# Altium footprint library TYCO THD.PcbLib: 146 footprints (part 8 of 11) (continued)
## TYCO_1734354-1 [mm] "Right Angle D-SUB 9 Female Contacts, Shell Size 9, With Threaded Insert (4-40 UNC). AMPLIMITE HD-20 Series" (continued)
  text "9" at 5.75,0.925 h1.2
3D body "TYCO_1734354-1.stp": height 12.52, standoff -4.07, extent -15.4,-2.902 15.4,15.518

## TYCO_1734366-1 [mm] "4 Position, Straight, USB 2.0 Type A Receptacle"
height 15
pads (6):
  round 1.6 hole 0.9: 1(-3.5,0) 2(-1,0) 3(1,0) 4(3.5,0)
  round 3 hole 2.3: 5(-6.57,-2.71) 5(6.57,-2.71)
Top Overlay:
  lines w0.2: -7.25,-0.99 -7.25,0.36 cw(c-6.95,0.36) -6.95,0.66 -6.25,0.66 ; -6.55,0.66 -6.55,0.96 ; -6.55,0.962 cw(c-5.912,0.962) -5.912,1.6 -5.61,1.6 ; -6.25,-0.888 -6.25,0.96 -6.25,0.962 cw(c-5.912,0.962) -5.912,1.3 -5.91,1.3 5.91,1.3 5.912,1.3 cw(c5.912,0.962) 6.25,0.962 6.25,0.96 6.25,-0.888 ; -6.25,-0.238 -5.68,-0.77 -5.68,-1.088 ; -5.61,-4.291 -5.61,-4.52 ccw(c-5.31,-4.52) -5.31,-4.82 5.31,-4.82 ccw(c5.31,-4.52) 5.61,-4.52 5.61,-4.291 ; -5.61,1.3 -5.61,2 cw(c-5.31,2) -5.31,2.3 5.31,2.3 cw(c5.31,2) 5.61,2 5.61,1.3 ; -5.55,-1.167 -5.55,-0.02 cw(c-4.91,-0.02) -4.91,0.62 -4.469,0.62 ; -5.473,-1.22 5.473,-1.22 ; -5.43,-1.22 -5.05,-0.84 ; -5.363,0.433 -5.05,0.12 ; -5.09,-3.82 5.09,-3.82 ; -4.644,0.12 -5.05,0.12 ; -4.285,-0.84 -5.05,-0.84 ; -3.8,-1.22 -3.8,-1.813 -3.2,-1.813 -3.2,-1.22 ; -3.72,-3.82 -3.603,-3.245 -2.384,-3.245 -2.27,-3.82 ; -1.3,-1.22 -1.3,-1.813 -0.7,-1.813 -0.7,-1.22 ; 0.7,-1.22 0.7,-1.813 1.3,-1.813 1.3,-1.22 ; 2.269,-3.82 2.386,-3.245 3.605,-3.245 3.719,-3.82 ; 3.2,-1.22 3.2,-1.813 3.8,-1.813 3.8,-1.22 ; 4.285,-0.84 5.05,-0.84 ; 4.469,0.62 4.91,0.62 cw(c4.91,-0.02) 5.55,-0.02 5.55,-1.167 ; 4.644,0.12 5.05,0.12 ; 5.363,0.433 5.05,0.12 ; 5.43,-1.22 5.05,-0.84 ; 5.61,1.6 5.91,1.6 5.912,1.6 cw(c5.912,0.962) 6.55,0.962 6.55,0.96 6.55,0.66 ; 5.68,-1.088 5.68,-0.765 6.25,-0.238 ; 6.25,-3.482 6.25,-3.48 ; 6.25,0.66 6.95,0.66 cw(c6.95,0.36) 7.25,0.36 7.25,-0.99 ; -5.05,-0.84 -5.05,0.12 ; 5.05,-0.84 5.05,0.12
Mechanical 8:
  lines w0.05: -7.07,-2.71 -6.57,-2.71 ; -6.57,-3.21 -6.57,-2.71 ; -6.57,-2.21 -6.57,-2.71 ; -6.07,-2.71 -6.57,-2.71 ; -4,0 -3.5,0 ; -3.5,-0.5 -3.5,0 ; -3.5,0.5 -3.5,0 ; -3,0 -3.5,0 ; -1.5,0 -1,0 ; -1,-0.5 -1,0 ; -1,0.5 -1,0 ; 0,-0.5 0,0 ; 0,0.5 0,0 ; 1,-0.5 1,0 ; 1,0.5 1,0 ; 1.5,0 1,0 ; 3,0 3.5,0 ; 3.5,-0.5 3.5,0 ; 3.5,0.5 3.5,0 ; 4,0 3.5,0 ; 6.07,-2.71 6.57,-2.71 ; 6.57,-3.21 6.57,-2.71 ; 6.57,-2.21 6.57,-2.71 ; 7.07,-2.71 6.57,-2.71 ; -3.5,0 -1,0 ; -1,0 -0.5,0 0,0 ; 0,0 0.5,0 1,0 ; 1,0 3.5,0
Mechanical 14:
  lines w0.1: -7.25,-1.824 -7.9,-1.91 -7.9,-3.43 -6.537,-3.611 ; -6.55,-3.18 -6.55,-3.48 -6.55,-3.482 ccw(c-5.912,-3.482) -5.912,-4.12 ; -6.55,0.66 -6.55,0.96 ; -6.55,0.962 cw(c-5.912,0.962) -5.912,1.6 -5.61,1.6 ; -6.25,-3.18 -6.95,-3.18 cw(c-6.95,-2.88) -7.25,-2.88 -7.25,0.36 cw(c-6.95,0.36) -6.95,0.66 -6.25,0.66 ; -6.25,-2.282 -5.68,-1.75 -5.68,-0.77 -6.25,-0.238 ; -5.91,-4.12 -5.912,-4.12 ; -5.61,-4.12 -5.912,-4.12 ; -5.61,-3.82 -5.61,-4.52 ccw(c-5.31,-4.52) -5.31,-4.82 5.31,-4.82 ccw(c5.31,-4.52) 5.61,-4.52 5.61,-3.82 ; -5.61,1.3 -5.61,2 cw(c-5.31,2) -5.31,2.3 5.31,2.3 cw(c5.31,2) 5.61,2 5.61,1.3 ; -5.43,-1.22 -5.05,-0.84 ; -5.363,0.433 -5.05,0.12 ; -3.8,-1.22 -3.8,-1.813 -3.2,-1.813 -3.2,-1.22 ; -3.72,-3.82 -3.603,-3.245 -2.384,-3.245 -2.27,-3.82 ; -3.72,1.3 -3.603,0.725 -2.384,0.725 -2.27,1.3 ; -1.3,-1.22 -1.3,-1.813 -0.7,-1.813 -0.7,-1.22 ; 0.7,-1.22 0.7,-1.813 1.3,-1.813 1.3,-1.22 ; 2.269,-3.82 2.386,-3.245 3.605,-3.245 3.719,-3.82 ; 2.269,1.3 2.386,0.725 3.605,0.725 3.719,1.3 ; 3.2,-1.22 3.2,-1.813 3.8,-1.813 3.8,-1.22 ; 5.363,0.433 5.05,0.12 ; 5.43,-1.22 5.05,-0.84 ; 5.61,-4.12 5.91,-4.12 5.912,-4.12 ccw(c5.912,-3.482) 6.55,-3.482 6.55,-3.48 6.55,-3.18 ; 5.61,1.6 5.91,1.6 5.912,1.6 cw(c5.912,0.962) 6.55,0.962 6.55,0.96 6.55,0.66 ; 6.25,-3.18 6.95,-3.18 ccw(c6.95,-2.88) 7.25,-2.88 7.25,0.36 ccw(c6.95,0.36) 6.95,0.66 6.25,0.66 ; 6.25,-2.282 5.68,-1.755 5.68,-0.765 6.25,-0.238 ; 6.537,-3.611 7.9,-3.43 7.9,-1.91 7.25,-1.824 ; -5.05,-0.84 -5.05,0.12 ; -5.05,-0.84 5.05,-0.84 ; -5.05,0.12 5.05,0.12 ; 5.05,-0.84 5.05,0.12 ; -6.25,-3.482 ccw(c-5.912,-3.482) -5.912,-3.82 -5.91,-3.82 5.91,-3.82 5.912,-3.82 ccw(c5.912,-3.482) 6.25,-3.482 6.25,-3.48 6.25,0.96 6.25,0.962 ccw(c5.912,0.962) 5.912,1.3 5.91,1.3 -5.91,1.3 -5.912,1.3 ccw(c-5.912,0.962) -6.25,0.962 -6.25,0.96 -6.25,-3.48 -6.25,-3.482 ; -5.55,-1.22 -5.55,-0.02 cw(c-4.91,-0.02) -4.91,0.62 4.91,0.62 cw(c4.91,-0.02) 5.55,-0.02 5.55,-1.22 -5.55,-1.22
3D body "TYCO_1734366-1.stp": height 15, standoff -3.93, extent -7.899,-4.82 7.9,2.3

## TYCO_1761014-1 [mm] "SFP+ 1x1 Press Fit Cage"
height 9.7
pads (30):
  rect 2x2 hole 1.05: 1(-14.25,-30.9) 2(-14.25,-20.9) 3(-14.25,-10.9) 4(-14.25,-0.9) 5(14.25,4.1) 6(14.25,-5.9) 7(14.25,-15.9) 8(14.25,-25.9) 9(-5.675,-30.9) 10(-8.575,-10.9) 11(-3.175,-10.9) 12(8.575,-30.9) 13(5.675,-10.9) 14(11.075,-10.9)
  round 2 hole 1.05: 15(0,-30.9) 16(0,-23.8) 17(0,-9.6) 18(0,-2.5)
  round 1.65 hole 0.95: 19(-14.25,-8.1) 20(-14.25,-3.4) 21(-14.25,1.6) 22(-11.925,7.475) 23(-7.125,7.475) 24(-2.325,7.475) 25(2.325,7.475) 26(7.125,7.475) 27(11.925,7.475) 28(14.25,1.6) 29(14.25,-3.4) 30(14.25,-8.1)
Top Overlay:
  drawing of 234 lines, arcs and shapes, not listed
Mechanical 8:
  drawing of 407 lines, arcs and shapes, not listed
  text "11" at -4.225,1.6 h1
  text "20" at -11.613,1.6 h1
  text "10" at -3.925,-2.6 h1
  text "1" at -10.775,-2.6 h1
  text "11" at 10.025,1.6 h1
  text "20" at 2.637,1.6 h1
  text "10" at 10.325,-2.6 h1
  text "1" at 3.475,-2.6 h1
Mechanical 14:
  drawing of 224 lines, arcs and shapes, not listed
Drill Drawing:
  lines w0.1: -12.5,-8.5 -11,-10 -11,-18 10.139,-18 ; -12,-21 10,-21 ; -15.75,-32.4 -15.75,8.975 15.75,8.975 15.75,-32.4 -15.75,-32.4
  text "12x diam. 0.95mm +/-0.05" at -10,-17.5 h1
  text "18x diam. 1.05mm +/-0.05" at -10,-20.5 h1
  text "PRESS-FIT TECHNOLOGY" at -8,-15 h1
3D body "TYCO_1761014-1.stp": height 10.37, standoff -2.06, extent -15.043,-42.4 15.043,7.854

## TYCO_1814655-3 [mm] "4 Positions, Pitch 2.54mm, Width 2.54mm, Heigh 4.4mm, SIP Straight Socket"
height 4.4
pads (4):
  round 1.5 hole 0.8: 1(0,0) 2(2.54,0) 3(5.08,0) 4(7.62,0)
Top Overlay:
  lines w0.2: 1.27,-0.77 1.27,0.77 ; 1.27,-0.77 1.77,-1.27 3.31,-1.27 3.81,-0.77 ; 1.27,-0.77 0.77,-1.27 -0.77,-1.27 -1.27,-0.77 -1.27,0.77 -0.77,1.27 0.77,1.27 1.27,0.77 ; 1.27,0.77 1.77,1.27 3.31,1.27 3.81,0.77 ; 3.81,-0.77 3.81,0.77 ; 3.81,-0.77 4.31,-1.27 5.85,-1.27 6.35,-0.77 ; 3.81,0.77 4.31,1.27 5.85,1.27 6.35,0.77 ; 6.35,-0.77 6.35,0.77 ; 6.35,-0.77 6.85,-1.27 8.39,-1.27 8.89,-0.77 8.89,0.77 8.39,1.27 6.85,1.27 6.35,0.77
Mechanical 8:
  lines w0.1: -1,0 0,0 ; 0,-1 0,0 ; 0,1 0,0 ; 1,0 0,0 ; 1.54,0 2.54,0 ; 2.54,-1 2.54,0 ; 2.54,1 2.54,0 ; 3.54,0 2.54,0 ; 4.08,0 5.08,0 ; 5.08,-1 5.08,0 ; 5.08,1 5.08,0 ; 6.08,0 5.08,0 ; 6.62,0 7.62,0 ; 7.62,-1 7.62,0 ; 7.62,1 7.62,0 ; 8.62,0 7.62,0
Mechanical 14:
  lines w0.1: 1.27,-0.77 1.27,0.77 ; 1.27,-0.77 1.77,-1.27 3.31,-1.27 3.81,-0.77 ; 1.27,-0.77 0.77,-1.27 -0.77,-1.27 -1.27,-0.77 -1.27,0.77 -0.77,1.27 0.77,1.27 1.27,0.77 ; 1.27,0.77 1.77,1.27 3.31,1.27 3.81,0.77 ; 3.81,-0.77 3.81,0.77 ; 3.81,-0.77 4.31,-1.27 5.85,-1.27 6.35,-0.77 ; 3.81,0.77 4.31,1.27 5.85,1.27 6.35,0.77 ; 6.35,-0.77 6.35,0.77 ; 6.35,-0.77 6.85,-1.27 8.39,-1.27 8.89,-0.77 8.89,0.77 8.39,1.27 6.85,1.27 6.35,0.77
3D body "TYCO_1814655-3.stp": height 4.4, standoff -2.9, extent -1.27,-1.27 8.89,1.27

## TYCO_1814655-3_a [mm] "1 of 4 Positions, Pitch 2.54mm, Width 2.54mm, Heigh 4.4mm, SIP Straight Socket"
height 4.4
pads (1):
  round 1.5 hole 0.8: 1(0,0)
Top Overlay:
  lines w0.2: -1.27,-0.77 -0.77,-1.27 0.77,-1.27 1.27,-0.77 1.27,0.77 0.77,1.27 -0.77,1.27 -1.27,0.77 -1.27,-0.77
Mechanical 8:
  lines w0.1: -1,0 0,0 ; 0,-1 0,0 ; 0,1 0,0 ; 1,0 0,0
Mechanical 14:
  lines w0.1: -1.27,-0.77 -0.77,-1.27 0.77,-1.27 1.27,-0.77 1.27,0.77 0.77,1.27 -0.77,1.27 -1.27,0.77 -1.27,-0.77
3D body "TYCO_1814655-3_a.stp": height 4.4, standoff -2.9, extent -1.27,-1.27 1.27,1.27

## TYCO_1814655-7 [mm] "10 Positions, Pitch 2.54mm, Width 2.54mm, Heigh 4.4mm, SIP Straight Socket"
height 4.4
pads (10):
  round 1.5 hole 0.8: 1(0,0) 2(2.54,0) 3(5.08,0) 4(7.62,0) 5(10.16,0) 6(12.7,0) 7(15.24,0) 8(17.78,0) 9(20.32,0) 10(22.86,0)
Top Overlay:
  lines w0.2: 1.27,-0.77 1.27,0.77 ; 1.27,-0.77 1.77,-1.27 3.31,-1.27 3.81,-0.77 ; 1.27,-0.77 0.77,-1.27 -0.77,-1.27 -1.27,-0.77 -1.27,0.77 -0.77,1.27 0.77,1.27 1.27,0.77 ; 1.27,0.77 1.77,1.27 3.31,1.27 3.81,0.77 ; 3.81,-0.77 3.81,0.77 ; 3.81,-0.77 4.31,-1.27 5.85,-1.27 6.35,-0.77 ; 3.81,0.77 4.31,1.27 5.85,1.27 6.35,0.77 ; 6.35,-0.77 6.35,0.77 ; 6.35,-0.77 6.85,-1.27 8.39,-1.27 8.89,-0.77 ; 6.35,0.77 6.85,1.27 8.39,1.27 8.89,0.77 ; 8.89,-0.77 8.89,0.77 ; 8.89,-0.77 9.39,-1.27 10.93,-1.27 11.43,-0.77 ; 8.89,0.77 9.39,1.27 10.93,1.27 11.43,0.77 ; 11.43,-0.77 11.43,0.77 ; 11.43,-0.77 11.93,-1.27 13.47,-1.27 13.97,-0.77 ; 11.43,0.77 11.93,1.27 13.47,1.27 13.97,0.77 ; 13.97,-0.77 13.97,0.77 ; 13.97,-0.77 14.47,-1.27 16.01,-1.27 16.51,-0.77 ; 13.97,0.77 14.47,1.27 16.01,1.27 16.51,0.77 ; 16.51,-0.77 16.51,0.77 ; 16.51,-0.77 17.01,-1.27 18.55,-1.27 19.05,-0.77 ; 16.51,0.77 17.01,1.27 18.55,1.27 19.05,0.77 ; 19.05,-0.77 19.05,0.77 ; 19.05,-0.77 19.55,-1.27 21.09,-1.27 21.59,-0.77 ; 19.05,0.77 19.55,1.27 21.09,1.27 21.59,0.77 ; 21.59,-0.77 21.59,0.77 ; 21.59,-0.77 22.09,-1.27 23.63,-1.27 24.13,-0.77 24.13,0.77 23.63,1.27 22.09,1.27 21.59,0.77
Mechanical 8:
  lines w0.1: -1,0 0,0 ; 0,-1 0,0 ; 0,1 0,0 ; 1,0 0,0 ; 1.54,0 2.54,0 ; 2.54,-1 2.54,0 ; 2.54,1 2.54,0 ; 3.54,0 2.54,0 ; 4.08,0 5.08,0 ; 5.08,-1 5.08,0 ; 5.08,1 5.08,0 ; 6.08,0 5.08,0 ; 6.62,0 7.62,0 ; 7.62,-1 7.62,0 ; 7.62,1 7.62,0 ; 8.62,0 7.62,0 ; 9.16,0 10.16,0 ; 10.16,-1 10.16,0 ; 10.16,1 10.16,0 ; 11.16,0 10.16,0 ; 11.7,0 12.7,0 ; 12.7,-1 12.7,0 ; 12.7,1 12.7,0 ; 13.7,0 12.7,0 ; 14.24,0 15.24,0 ; 15.24,-1 15.24,0 ; 15.24,1 15.24,0 ; 16.24,0 15.24,0 ; 16.78,0 17.78,0 ; 17.78,-1 17.78,0 ; 17.78,1 17.78,0 ; 18.78,0 17.78,0 ; 19.32,0 20.32,0 ; 20.32,-1 20.32,0 ; 20.32,1 20.32,0 ; 21.32,0 20.32,0 ; 21.86,0 22.86,0 ; 22.86,-1 22.86,0 ; 22.86,1 22.86,0 ; 23.86,0 22.86,0
Mechanical 14:
  lines w0.1: 1.27,-0.77 1.27,0.77 ; 1.27,-0.77 1.77,-1.27 3.31,-1.27 3.81,-0.77 ; 1.27,-0.77 0.77,-1.27 -0.77,-1.27 -1.27,-0.77 -1.27,0.77 -0.77,1.27 0.77,1.27 1.27,0.77 ; 1.27,0.77 1.77,1.27 3.31,1.27 3.81,0.77 ; 3.81,-0.77 3.81,0.77 ; 3.81,-0.77 4.31,-1.27 5.85,-1.27 6.35,-0.77 ; 3.81,0.77 4.31,1.27 5.85,1.27 6.35,0.77 ; 6.35,-0.77 6.35,0.77 ; 6.35,-0.77 6.85,-1.27 8.39,-1.27 8.89,-0.77 ; 6.35,0.77 6.85,1.27 8.39,1.27 8.89,0.77 ; 8.89,-0.77 8.89,0.77 ; 8.89,-0.77 9.39,-1.27 10.93,-1.27 11.43,-0.77 ; 8.89,0.77 9.39,1.27 10.93,1.27 11.43,0.77 ; 11.43,-0.77 11.43,0.77 ; 11.43,-0.77 11.93,-1.27 13.47,-1.27 13.97,-0.77 ; 11.43,0.77 11.93,1.27 13.47,1.27 13.97,0.77 ; 13.97,-0.77 13.97,0.77 ; 13.97,-0.77 14.47,-1.27 16.01,-1.27 16.51,-0.77 ; 13.97,0.77 14.47,1.27 16.01,1.27 16.51,0.77 ; 16.51,-0.77 16.51,0.77 ; 16.51,-0.77 17.01,-1.27 18.55,-1.27 19.05,-0.77 ; 16.51,0.77 17.01,1.27 18.55,1.27 19.05,0.77 ; 19.05,-0.77 19.05,0.77 ; 19.05,-0.77 19.55,-1.27 21.09,-1.27 21.59,-0.77 ; 19.05,0.77 19.55,1.27 21.09,1.27 21.59,0.77 ; 21.59,-0.77 21.59,0.77 ; 21.59,-0.77 22.09,-1.27 23.63,-1.27 24.13,-0.77 24.13,0.77 23.63,1.27 22.09,1.27 21.59,0.77
3D body "TYCO_1814655-7.stp": height 4.4, standoff -2.9, extent -1.27,-1.27 24.13,1.27

## TYCO_1814655-7_a [mm] "1 of 10 Positions, Pitch 2.54mm, Width 2.54mm, Heigh 4.4mm, SIP Straight Socket"
height 4.4
pads (1):
  round 1.5 hole 0.8: 1(0,0)
Top Overlay:
  lines w0.2: -1.27,-0.77 -0.77,-1.27 0.77,-1.27 1.27,-0.77 1.27,0.77 0.77,1.27 -0.77,1.27 -1.27,0.77 -1.27,-0.77
Mechanical 8:
  lines w0.1: -1,0 0,0 ; 0,-1 0,0 ; 0,1 0,0 ; 1,0 0,0
Mechanical 14:
  lines w0.1: -1.27,-0.77 -0.77,-1.27 0.77,-1.27 1.27,-0.77 1.27,0.77 0.77,1.27 -0.77,1.27 -1.27,0.77 -1.27,-0.77
3D body "TYCO_1814655-7_a.stp": height 4.4, standoff -2.9, extent -1.27,-1.27 1.27,1.27

## TYCO_1840061-1 [mm] "1 Port, Without LED, RJ45 10/100Base-T Ethernet Vertical Connector Module With Integrated Magnetics"
height 16.51
pads (12):
  round 1.6 hole 0.9: 1(-4.445,-1.27) 2(-3.175,1.27) 3(-1.905,-1.27) 4(-0.635,1.27) 5(0.635,-1.27) 6(1.905,1.27) 7(3.175,-1.27) 8(4.445,1.27)
  round 2.3 hole 1.6: 9(-7.747,-4.572) 10(7.747,-4.572)
  round 0.5 hole 3.2 unplated mask+1.35: M1(-5.715,-7.62) M2(5.715,-7.62)
Top Overlay:
  lines w0.2: -8,-6.101 -8,-13.87 ccw(c-7.65,-13.87) -7.65,-14.22 7.65,-14.22 ccw(c7.65,-13.87) 8,-13.87 8,-6.101 ; -8,-3.043 -8,7.02 cw(c-7.65,7.02) -7.65,7.37 7.65,7.37 cw(c7.65,7.02) 8,7.02 8,-3.043 ; -6.382,-5.31 -6.2,-5.31 -6.2,-3.31 cw(c-6,-3.31) -6,-3.11 6,-3.11 cw(c6,-3.31) 6.2,-3.31 6.2,-5.31 6.382,-5.31 ; -6.2,-9.562 -6.2,-10.22 ccw(c-6,-10.22) -6,-10.42 -3.595,-10.42 cw(c-3.595,-10.62) -3.395,-10.62 -3.395,-12.02 ccw(c-3.195,-12.02) -3.195,-12.22 -2.475,-12.22 cw(c-2.475,-12.42) -2.275,-12.42 -2.275,-13.32 ccw(c-2.075,-13.32) -2.075,-13.52 2.075,-13.52 ccw(c2.075,-13.32) 2.275,-13.32 2.275,-12.42 cw(c2.475,-12.42) 2.475,-12.22 3.195,-12.22 ccw(c3.195,-12.02) 3.395,-12.02 3.395,-10.62 cw(c3.595,-10.62) 3.595,-10.42 6,-10.42 ccw(c6,-10.22) 6.2,-10.22 6.2,-9.562 ; -5.955,-9.607 -5.955,-10.25 -3.15,-10.25 ; -5.955,-5.636 -5.955,-3.42 5.955,-3.42 5.955,-5.636 ; -4.379,-9.11 -3.15,-9.11 ; -3.78,-3.42 -3.78,-6.654 -3.32,-6.654 -3.32,-3.42 ; -2.764,-3.42 -2.764,-6.654 -2.304,-6.654 -2.304,-3.42 ; -1.748,-3.42 -1.748,-6.654 -1.288,-6.654 -1.288,-3.42 ; -0.732,-3.42 -0.732,-6.654 -0.272,-6.654 -0.272,-3.42 ; 0.284,-3.42 0.284,-6.654 0.744,-6.654 0.744,-3.42 ; 1.3,-3.42 1.3,-6.654 1.76,-6.654 1.76,-3.42 ; 2.316,-3.42 2.316,-6.654 2.776,-6.654 2.776,-3.42 ; 3.15,-10.25 5.955,-10.25 5.955,-9.607 ; 3.15,-9.11 4.379,-9.11 ; 3.332,-3.42 3.332,-6.654 3.792,-6.654 3.792,-3.42 ; -3.15,-11.92 -2.03,-11.92 -2.03,-13.22 2.03,-13.22 2.03,-11.92 3.15,-11.92 3.15,-7.84 -3.15,-7.84 -3.15,-11.92
Mechanical 8:
  lines w0.1: -8.245,-4.572 -7.745,-4.572 ; -7.745,-5.072 -7.745,-4.572 ; -7.745,-4.072 -7.745,-4.572 ; -7.245,-4.572 -7.745,-4.572 ; -6.215,-7.622 -5.715,-7.622 ; -5.715,-8.122 -5.715,-7.622 ; -5.715,-7.122 -5.715,-7.622 ; -5.215,-7.622 -5.715,-7.622 ; -4.945,-1.272 -4.445,-1.272 ; -4.445,-1.772 -4.445,-1.272 ; -4.445,-0.772 -4.445,-1.272 ; -3.945,-1.272 -4.445,-1.272 ; -3.675,1.268 -3.175,1.268 ; -3.175,0.768 -3.175,1.268 ; -3.175,1.768 -3.175,1.268 ; -2.675,1.268 -3.175,1.268 ; -2.405,-1.272 -1.905,-1.272 ; -1.905,-1.772 -1.905,-1.272 ; -1.905,-0.772 -1.905,-1.272 ; -1.405,-1.272 -1.905,-1.272 ; -1.135,1.268 -0.635,1.268 ; -0.635,0.768 -0.635,1.268 ; -0.635,1.768 -0.635,1.268 ; -0.5,0 0,0 ; -0.135,1.268 -0.635,1.268 ; 0,-0.5 0,0 ; 0,0.5 0,0 ; 0.135,-1.272 0.635,-1.272 ; 0.5,0 0,0 ; 0.635,-1.772 0.635,-1.272 ; 0.635,-0.772 0.635,-1.272 ; 1.135,-1.272 0.635,-1.272 ; 1.405,1.268 1.905,1.268 ; 1.905,0.768 1.905,1.268 ; 1.905,1.768 1.905,1.268 ; 2.405,1.268 1.905,1.268 ; 2.675,-1.272 3.175,-1.272 ; 3.175,-1.772 3.175,-1.272 ; 3.175,-0.772 3.175,-1.272 ; 3.675,-1.272 3.175,-1.272 ; 3.945,1.268 4.445,1.268 ; 4.445,0.768 4.445,1.268 ; 4.445,1.768 4.445,1.268 ; 4.945,1.268 4.445,1.268 ; 5.215,-7.622 5.715,-7.622 ; 5.715,-8.122 5.715,-7.622 ; 5.715,-7.122 5.715,-7.622 ; 6.215,-7.622 5.715,-7.622 ; 7.245,-4.572 7.745,-4.572 ; 7.745,-5.072 7.745,-4.572 ; 7.745,-4.072 7.745,-4.572 ; 8.245,-4.572 7.745,-4.572
Mechanical 14:
  lines w0.1: -6.635,-7.85 -5.449,-7.85 -5.449,-5.82 -6.635,-5.82 ; -5.955,-9.11 -3.15,-9.11 ; -5.955,-7.85 -5.955,-10.25 -3.15,-10.25 ; -5.955,-5.82 -5.955,-3.42 5.955,-3.42 5.955,-5.82 ; -3.78,-3.42 -3.78,-6.654 -3.32,-6.654 -3.32,-3.42 ; -2.764,-3.42 -2.764,-6.654 -2.304,-6.654 -2.304,-3.42 ; -1.748,-3.42 -1.748,-6.654 -1.288,-6.654 -1.288,-3.42 ; -0.732,-3.42 -0.732,-6.654 -0.272,-6.654 -0.272,-3.42 ; 0.284,-3.42 0.284,-6.654 0.744,-6.654 0.744,-3.42 ; 1.3,-3.42 1.3,-6.654 1.76,-6.654 1.76,-3.42 ; 2.316,-3.42 2.316,-6.654 2.776,-6.654 2.776,-3.42 ; 3.15,-10.25 5.955,-10.25 5.955,-7.85 ; 3.15,-9.11 5.954,-9.11 ; 3.332,-3.42 3.332,-6.654 3.792,-6.654 3.792,-3.42 ; 6.635,-7.85 5.48,-7.85 5.48,-5.82 6.635,-5.82 ; -8,-13.87 ccw(c-7.65,-13.87) -7.65,-14.22 7.65,-14.22 ccw(c7.65,-13.87) 8,-13.87 8,7.02 ccw(c7.65,7.02) 7.65,7.37 -7.65,7.37 ccw(c-7.65,7.02) -8,7.02 -8,-13.87 ; -6.635,-8.36 -6.635,-5.31 -6.2,-5.31 -6.2,-3.31 cw(c-6,-3.31) -6,-3.11 6,-3.11 cw(c6,-3.31) 6.2,-3.31 6.2,-5.31 6.635,-5.31 6.635,-8.36 6.2,-8.36 6.2,-10.22 cw(c6,-10.22) 6,-10.42 3.595,-10.42 ccw(c3.595,-10.62) 3.395,-10.62 3.395,-12.02 cw(c3.195,-12.02) 3.195,-12.22 2.475,-12.22 ccw(c2.475,-12.42) 2.275,-12.42 2.275,-13.32 cw(c2.075,-13.32) 2.075,-13.52 -2.075,-13.52 cw(c-2.075,-13.32) -2.275,-13.32 -2.275,-12.42 ccw(c-2.475,-12.42) -2.475,-12.22 -3.195,-12.22 cw(c-3.195,-12.02) -3.395,-12.02 -3.395,-10.62 ccw(c-3.595,-10.62) -3.595,-10.42 -6,-10.42 cw(c-6,-10.22) -6.2,-10.22 -6.2,-8.36 -6.635,-8.36 ; -3.15,-11.92 -2.03,-11.92 -2.03,-13.22 2.03,-13.22 2.03,-11.92 3.15,-11.92 3.15,-7.84 -3.15,-7.84 -3.15,-11.92
Mechanical 15:
  lines w0.1: -8.25,-14.47 8.25,-14.47 8.25,7.62 -8.25,7.62 -8.25,-14.47
3D body "TYCO_1840061-1.stp": height 16.51, standoff -4, extent -8,-14.22 8,7.37

## TYCO_1888250-1 [mm] "1 Port, Yellow/Green LEDs, RJ45 10/100Base-T, Cat 5, Ethernet Connector Module"
height 7.38
pads (16):
  round 1.3 hole 0.8: 1(-3.556,1.27) 2(-2.54,-1.27) 3(-1.524,1.27) 4(-0.508,-1.27) 5(0.508,1.27) 6(1.524,-1.27) 7(2.54,1.27) 8(3.556,-1.27)
  round 1.1 hole 0.6: 9(4.14,-4.57) 10(5.58,-6.87) 11(-5.58,-4.57) 12(-4.14,-6.87)
  round 1.55 hole 1.05: SHIELD(-8.045,-2.12) SHIELD(-6,3.48) SHIELD(6,3.48) SHIELD(8.045,-2.12)
Top Overlay:
  lines w0.2: -8.345,-3.256 -8.345,-12.32 -8.145,-12.32 ; -8.345,-0.984 -8.345,3.58 -7.171,3.58 ; -8.145,-22.12 8.145,-22.12 ; -8.145,-20.703 -9.015,-18.311 cw(c-8.545,-18.14) -9.045,-18.14 -9.045,-17.84 -9.245,-17.84 -9.245,-18.14 ccw(c-8.545,-18.14) -9.203,-18.379 -8.19,-21.164 ; -8.145,-3.291 -8.145,-22.32 8.145,-22.32 8.145,-3.291 ; -8.145,-0.949 -8.145,3.78 -7.136,3.78 ; -5.841,-22.326 ccw(c-5.029,-20.72) -5.16,-22.515 ccw(c-5.291,-20.72) -4.47,-22.322 ; -4.829,3.58 4.829,3.58 ; -4.482,-18.052 ccw(c-4.729,-18.09) -4.729,-17.84 -5.551,-17.84 ccw(c-5.551,-18.09) -5.798,-18.052 -6.359,-21.42 ; -4.475,-18.051 -3.921,-21.42 ; -1.119,3.58 -1.119,4.22 1.125,4.22 1.125,3.58 ; 4.471,-22.322 ccw(c5.291,-20.72) 5.16,-22.515 ccw(c5.029,-20.72) 5.843,-22.325 ; 5.798,-18.052 ccw(c5.551,-18.09) 5.551,-17.84 4.729,-17.84 ccw(c4.729,-18.09) 4.482,-18.052 3.921,-21.42 ; 5.805,-18.051 6.359,-21.42 ; 7.136,3.78 8.145,3.78 8.145,-0.949 ; 7.171,3.58 8.345,3.58 8.345,-0.984 ; 8.145,-21.42 8.165,-21.303 9.205,-18.374 ccw(c8.545,-18.14) 9.245,-18.14 ; 8.145,-20.762 9.016,-18.307 ccw(c8.545,-18.14) 9.045,-18.14 9.045,-17.84 9.245,-17.84 9.245,-18.143 ; 8.145,-12.32 8.345,-12.32 8.345,-3.256 ; -8.19,-21.164 -8.145,-21.42 -8.19,-21.164 ; -6.359,-21.42 -6.39,-21.67 -6.938,-21.67 -6.257,-17.79 cw(c-5.519,-17.92) -5.519,-17.17 -4.761,-17.17 cw(c-4.761,-17.92) -4.023,-17.79 -3.342,-21.67 -3.89,-21.67 -3.921,-21.42 ; -6.359,-21.42 -3.921,-21.42 ; 3.921,-21.42 3.89,-21.67 3.342,-21.67 4.023,-17.79 cw(c4.761,-17.92) 4.761,-17.17 5.519,-17.17 cw(c5.519,-17.92) 6.257,-17.79 6.938,-21.67 6.39,-21.67 6.359,-21.42 ; 3.921,-21.42 6.359,-21.42
Mechanical 8:
  lines w0.1: -8.545,-2.12 -8.045,-2.12 ; -8.15,-8.37 8.15,-8.37 ; -8.045,-2.62 -8.045,-2.12 ; -8.045,-1.62 -8.045,-2.12 ; -7.545,-2.12 -8.045,-2.12 ; -6.5,3.48 -6,3.48 ; -6.08,-4.57 -5.58,-4.57 ; -6,2.98 -6,3.48 ; -6,3.98 -6,3.48 ; -5.58,-5.07 -5.58,-4.57 ; -5.58,-4.07 -5.58,-4.57 ; -5.5,3.48 -6,3.48 ; -5.08,-4.57 -5.58,-4.57 ; -4.64,-6.87 -4.14,-6.87 ; -4.14,-7.37 -4.14,-6.87 ; -4.14,-6.37 -4.14,-6.87 ; -4.056,1.27 -3.556,1.27 ; -3.64,-6.87 -4.14,-6.87 ; -3.556,0.77 -3.556,1.27 ; -3.556,1.77 -3.556,1.27 ; -3.056,1.27 -3.556,1.27 ; -3.04,-1.27 -2.54,-1.27 ; -2.54,-1.77 -2.54,-1.27 ; -2.54,-0.77 -2.54,-1.27 ; -2.04,-1.27 -2.54,-1.27 ; -2.024,1.27 -1.524,1.27 ; -1.524,0.77 -1.524,1.27 ; -1.524,1.77 -1.524,1.27 ; -1.024,1.27 -1.524,1.27 ; -1.008,-1.27 -0.508,-1.27 ; -0.508,-1.77 -0.508,-1.27 ; -0.508,-0.77 -0.508,-1.27 ; -0.5,0 0,0 ; -0.008,-1.27 -0.508,-1.27 ; 0,-0.5 0,0 ; 0,0.5 0,0 ; 0.008,1.27 0.508,1.27 ; 0.5,0 0,0 ; 0.508,0.77 0.508,1.27 ; 0.508,1.77 0.508,1.27 ; 1.008,1.27 0.508,1.27 ; 1.024,-1.27 1.524,-1.27 ; 1.524,-1.77 1.524,-1.27 ; 1.524,-0.77 1.524,-1.27 ; 2.024,-1.27 1.524,-1.27 ; 2.04,1.27 2.54,1.27 ; 2.54,0.77 2.54,1.27 ; 2.54,1.77 2.54,1.27 ; 3.04,1.27 2.54,1.27 ; 3.056,-1.27 3.556,-1.27 ; 3.556,-1.77 3.556,-1.27 ; 3.556,-0.77 3.556,-1.27 ; 3.64,-4.57 4.14,-4.57 ; 4.056,-1.27 3.556,-1.27 ; 4.14,-5.07 4.14,-4.57 ; 4.14,-4.07 4.14,-4.57 ; 4.64,-4.57 4.14,-4.57 ; 5.08,-6.87 5.58,-6.87 ; 5.5,3.48 6,3.48 ; 5.58,-7.37 5.58,-6.87 ; 5.58,-6.37 5.58,-6.87 ; 6,2.98 6,3.48 ; 6,3.98 6,3.48 ; 6.08,-6.87 5.58,-6.87 ; 6.5,3.48 6,3.48 ; 7.545,-2.12 8.045,-2.12 ; 8.045,-2.62 8.045,-2.12 ; 8.045,-1.62 8.045,-2.12 ; 8.545,-2.12 8.045,-2.12
Mechanical 14:
  lines w0.1: -8.145,-22.12 8.145,-22.12 ; -8.145,-20.703 -9.015,-18.311 cw(c-8.545,-18.14) -9.045,-18.14 -9.045,-17.84 -9.245,-17.84 -9.245,-18.14 ccw(c-8.545,-18.14) -9.203,-18.379 -8.19,-21.164 ; -8.145,-12.32 -8.345,-12.32 -8.345,3.58 8.345,3.58 8.345,-12.32 8.145,-12.32 ; -6.395,3.58 -6.395,3.78 -8.145,3.78 -8.145,-22.32 8.145,-22.32 8.145,3.78 6.395,3.78 6.395,3.58 ; -5.841,-22.326 ccw(c-5.029,-20.72) -5.16,-22.515 ccw(c-5.291,-20.72) -4.47,-22.322 ; -4.482,-18.052 ccw(c-4.729,-18.09) -4.729,-17.84 -5.551,-17.84 ccw(c-5.551,-18.09) -5.798,-18.052 -6.359,-21.42 ; -4.475,-18.051 -3.921,-21.42 ; -1.119,3.58 -1.119,4.22 1.125,4.22 1.125,3.58 ; 4.473,-22.323 ccw(c5.291,-20.72) 5.16,-22.515 ccw(c5.029,-20.72) 5.851,-22.321 ; 5.798,-18.052 ccw(c5.551,-18.09) 5.551,-17.84 4.729,-17.84 ccw(c4.729,-18.09) 4.482,-18.052 3.921,-21.42 ; 5.805,-18.051 6.359,-21.42 ; 8.145,-21.42 8.165,-21.303 9.205,-18.374 ccw(c8.545,-18.14) 9.245,-18.14 ; 8.145,-20.762 9.016,-18.307 ccw(c8.545,-18.14) 9.045,-18.14 9.045,-17.84 9.245,-17.84 9.245,-18.143 ; -8.19,-21.164 -8.145,-21.42 -8.19,-21.164 ; -6.359,-21.42 -6.39,-21.67 -6.938,-21.67 -6.257,-17.79 cw(c-5.519,-17.92) -5.519,-17.17 -4.761,-17.17 cw(c-4.761,-17.92) -4.023,-17.79 -3.342,-21.67 -3.89,-21.67 -3.921,-21.42 ; -6.359,-21.42 -3.921,-21.42 ; 3.921,-21.42 3.89,-21.67 3.342,-21.67 4.023,-17.79 cw(c4.761,-17.92) 4.761,-17.17 5.519,-17.17 cw(c5.519,-17.92) 6.257,-17.79 6.938,-21.67 6.39,-21.67 6.359,-21.42 ; 3.921,-21.42 6.359,-21.42
Drill Drawing:
  lines w0.1: -9.25,-8.355 -9.25,5 9.245,5 9.245,-8.355 -7.08,-8.355 -9.25,-8.355
  text "PRESS-FIT TECHNOLOGY" at -8.5,-10 h1
  text "Diameter Tolerance" at -6.5,-11.5 h1
  text "+0.05/-0.05" at -4.5,-13 h1
3D body "TYCO_1888250-1.stp": height 8.48, standoff -5.3, extent -9.245,-22.515 9.245,4.22